# Altium footprint library DIOT_PSU_integrated.PcbLib: 35 footprints (part 1 of 3)
Each footprint in its own frame and in the unit in brackets; x right, y up, seen from the top. Pads: shape width x height; smd on the part's side, far side on the other; paste and mask are expansions set on the pad; w line width, h text height; cw(c..) or ccw(c..) is an arc to the next point about the centre after c.
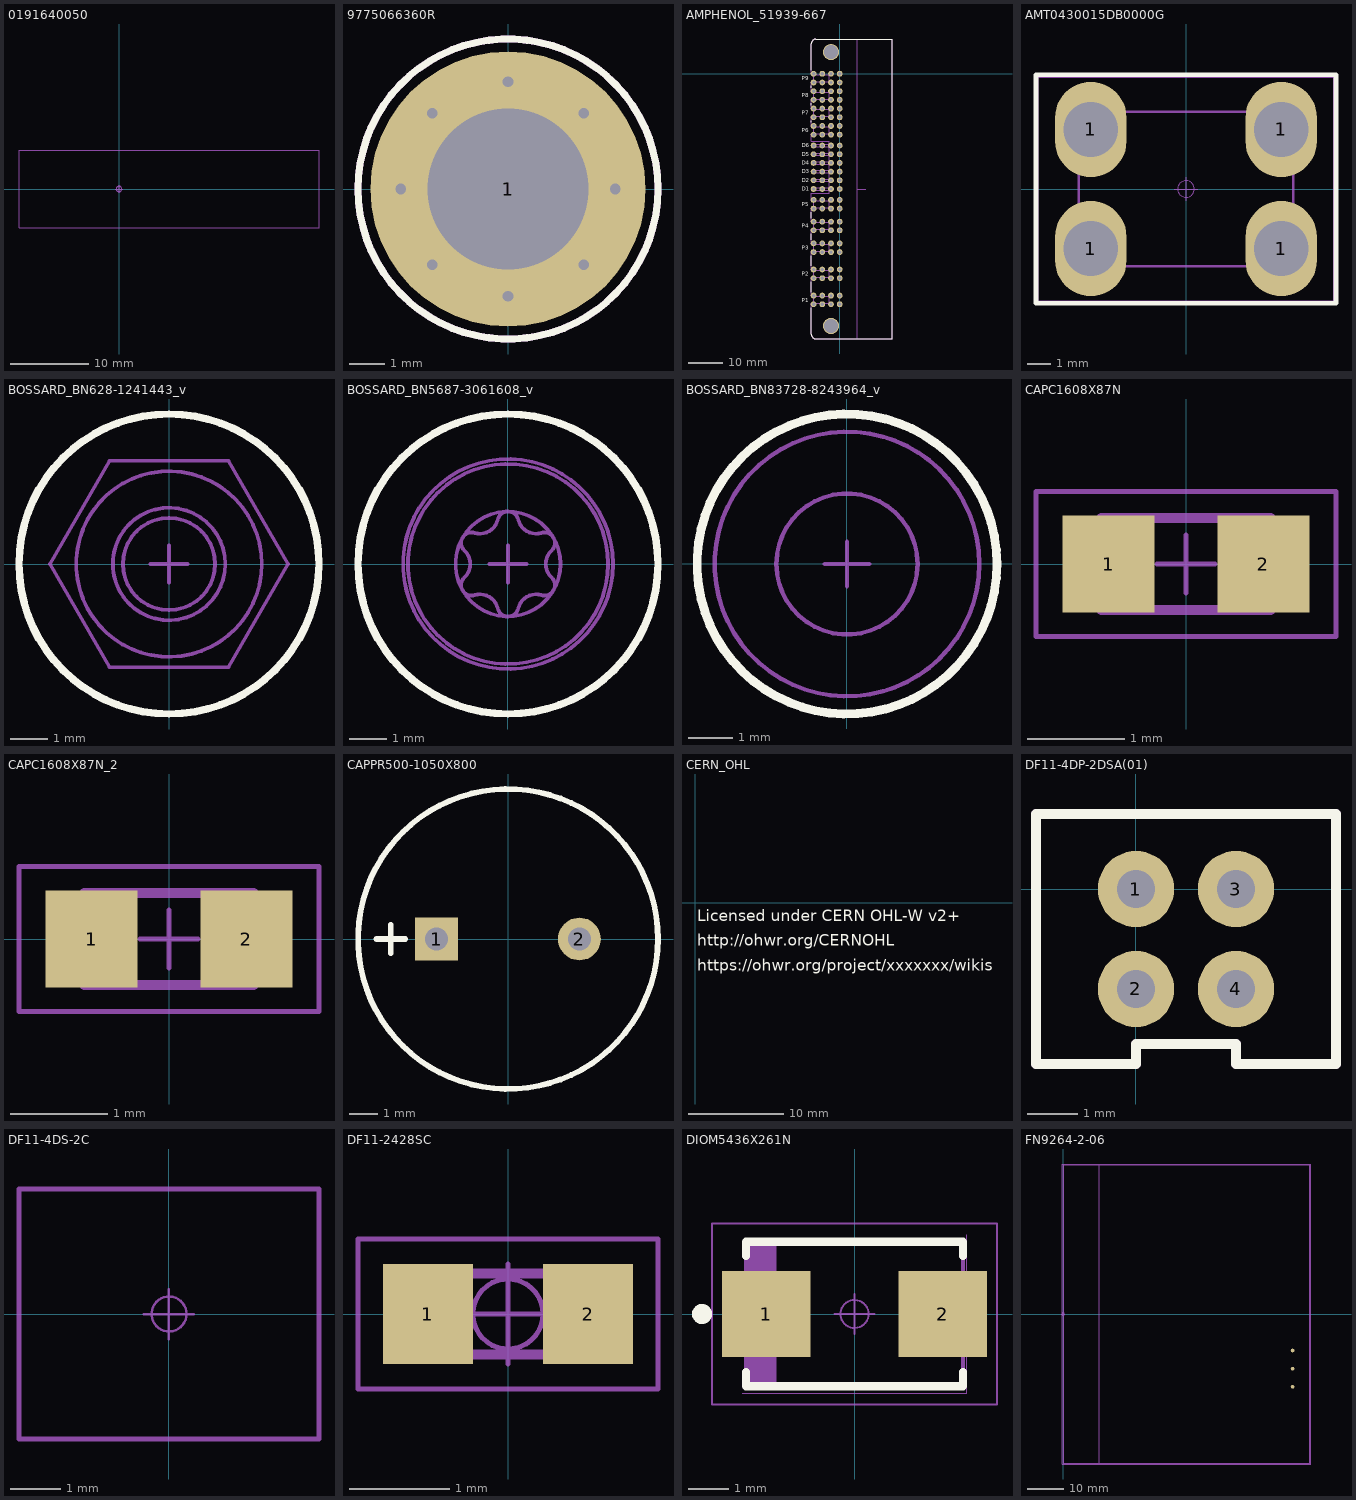
[diagram p0: the footprints below, top view; thin cyan lines are the x and y axes]

## 0191640050 [mm]
Mechanical 15:
  circle w0.05: c0,0 r0.35
  lines w0.05: -0.5,0 0.5,0 ; 0,-0.5 0,0.5 ; -12.7,-4.95 -12.7,4.95 25.4,4.95 25.4,-4.95 -12.7,-4.95
3D body "191640050.stp": height 3.85, standoff -3.85, extent -12.7,-4.953 25.4,4.953

## 9775066360R [mm]
pads (1):
  round 7.7 / inner round 6.6 / far side round 6.6 hole 4.5: 1(0,0)
via -3,0 diameter 0.6 hole 0.3
via -2.121,2.121 diameter 0.6 hole 0.3
via -2.121,-2.121 diameter 0.6 hole 0.3
via 3,0 diameter 0.6 hole 0.3
via 0,3 diameter 0.6 hole 0.3
via 0,-3 diameter 0.6 hole 0.3
via 2.121,-2.121 diameter 0.6 hole 0.3
via 2.121,2.121 diameter 0.6 hole 0.3
Top Overlay:
  circle w0.2: c0,0 r4.2
Top Paste:
  lines w1.4: -2.917,0.892 cw(c0,0) -2.718,1.385 ; -2.901,-0.943 ccw(c0,0) -2.693,-1.432 ; -1.432,2.693 cw(c0,0) -0.943,2.901 ; -1.385,-2.718 ccw(c0,0) -0.892,-2.917 ; 0.892,2.917 cw(c0,0) 1.385,2.718 ; 0.943,-2.901 ccw(c0,0) 1.432,-2.693 ; 2.693,1.432 cw(c0,0) 2.901,0.943 ; 2.718,-1.385 ccw(c0,0) 2.917,-0.892
Mechanical 14:
  circle w0.2: c0,0 r4.2
Mechanical 15:
  circle w0.05: c0,0 r0.35
  lines w0.05: -0.5,0 0.5,0 ; 0,-0.5 0,0.5 ; -1.5,-0.75 1.5,-0.75 1.5,0.75 -1.5,0.75 -1.5,-0.75
3D body "9775066360 (rev1).stp": height 1, standoff -6.6, extent -3,-2.997 2.988,2.997

## AMPHENOL_51939-667 [mm]
pads (98):
  round 1.7 hole 1: A1(0,-33.66) A2(0,-31.12) A3(0,-28.58) A4(0,-26.04) A5(0,-23.5) A6(0,-20.96) B1(-2.54,-33.66) B2(-2.54,-31.12) B3(-2.54,-28.58) B4(-2.54,-26.04) B5(-2.54,-23.5) B6(-2.54,-20.96) C1(-5.08,-33.66) C2(-5.08,-31.12) C3(-5.08,-28.58) C4(-5.08,-26.04) C5(-5.08,-23.5) C6(-5.08,-20.96) D1(-7.62,-33.66) D2(-7.62,-31.12) D3(-7.62,-28.58) D4(-7.62,-26.04) D5(-7.62,-23.5) D6(-7.62,-20.96) P1(-7.62,-67.32) P1(-7.62,-64.78) P1(-5.08,-67.32) P1(-5.08,-64.78) P1(-2.54,-67.32) P1(-2.54,-64.78) P1(0,-67.32) P1(0,-64.78) P2(-7.62,-59.7) P2(-7.62,-57.16) P2(-5.08,-59.7) P2(-5.08,-57.16) P2(-2.54,-59.7) P2(-2.54,-57.16) P2(0,-59.7) P2(0,-57.16) P3(-7.62,-52.08) P3(-7.62,-49.54) P3(-5.08,-52.08) P3(-5.08,-49.54) P3(-2.54,-52.08) P3(-2.54,-49.54) P3(0,-52.08) P3(0,-49.54) P4(-7.62,-45.73) P4(-7.62,-43.19) P4(-5.08,-45.73) P4(-5.08,-43.19) P4(-2.54,-45.73) P4(-2.54,-43.19) P4(0,-45.73) P4(0,-43.19) P5(-7.62,-39.38) P5(-7.62,-36.84) P5(-5.08,-39.38) P5(-5.08,-36.84) P5(-2.54,-39.38) P5(-2.54,-36.84) P5(0,-39.38) P5(0,-36.84) P6(-7.62,-17.78) P6(-7.62,-15.24) P6(-5.08,-17.78) P6(-5.08,-15.24) P6(-2.54,-17.78) P6(-2.54,-15.24) P6(0,-17.78) P6(0,-15.24) P7(-7.62,-12.7) P7(-7.62,-10.16) P7(-5.08,-12.7) P7(-5.08,-10.16) P7(-2.54,-12.7) P7(-2.54,-10.16) P7(0,-12.7) P7(0,-10.16) P8(-7.62,-7.62) P8(-7.62,-5.08) P8(-5.08,-7.62) P8(-5.08,-5.08) P8(-2.54,-7.62) P8(-2.54,-5.08) P8(0,-7.62) P8(0,-5.08) P9(-7.62,-2.54) P9(-7.62,0) P9(-5.08,-2.54) P9(-5.08,0) P9(-2.54,-2.54) P9(-2.54,0) P9(0,-2.54) P9(0,0)
  round 4.7 / inner round 4.7 / far side round 8 hole 4: MTG1(-2.54,6.345) MTG2(-2.54,-73.665)
Top Overlay:
  lines w0.2: -8.255,-68.338 -8.255,-76.149 ccw(c-6.934,-76.149) -6.934,-77.47 15.367,-77.47 15.367,10.16 -6.934,10.16 ccw(c-6.934,8.839) -8.255,8.839 -8.255,1.018 ; -8.255,-63.762 -8.255,-60.718 ; -8.255,-56.142 -8.255,-53.098 ; -8.255,-48.522 -8.255,-46.748 ; -8.255,-42.172 -8.255,-40.398 ; -8.255,-14.222 -8.255,-13.718 ; -8.255,-9.142 -8.255,-8.638 ; -8.255,-4.062 -8.255,-3.558
  text "D6" at -11.1,-21.5 h1.2
  text "D5" at -11.1,-24.14 h1.2
  text "D4" at -11.1,-26.58 h1.2
  text "D3" at -11.1,-29.12 h1.2
  text "D2" at -11.1,-31.66 h1.2
  text "D1" at -11.1,-34.2 h1.2
  text "P9" at -11.1,-1.84 h1.2
  text "P8" at -11.1,-6.92 h1.2
  text "P7" at -11.1,-12 h1.2
  text "P6" at -11.1,-17.08 h1.2
  text "P5" at -11.1,-38.68 h1.2
  text "P4" at -11.1,-45.03 h1.2
  text "P3" at -11.1,-51.38 h1.2
  text "P2" at -11.1,-59 h1.2
  text "P1" at -11.1,-66.7 h1.2
Mechanical 8:
  drawing of 404 lines, arcs and shapes, not listed
  text "PCB" at 4.4,-35.3 h1.2
Mechanical 14:
  circle w0.1: c-2.54,-73.66 r1.905
  circle w0.1: c-2.54,6.35 r1.905
  lines w0.1: -3.048,-33.985 -7.95,-33.985 -7.95,-33.325 -3.048,-33.325 ; -3.048,-31.445 -7.95,-31.445 -7.95,-30.785 -3.048,-30.785 ; -3.048,-28.905 -7.95,-28.905 -7.95,-28.245 -3.048,-28.245 ; -3.048,-26.365 -7.95,-26.365 -7.95,-25.705 -3.048,-25.705 ; -3.048,-23.825 -7.95,-23.825 -7.95,-23.165 -3.048,-23.165 ; -3.048,-21.285 -7.95,-21.285 -7.95,-20.625 -3.048,-20.625 ; -8.255,-76.149 ccw(c-6.934,-76.149) -6.934,-77.47 15.367,-77.47 15.367,10.16 -6.934,10.16 ccw(c-6.934,8.839) -8.255,8.839 -8.255,-0.254 -3.048,-0.254 -3.048,-2.286 -8.255,-2.286 -8.255,-5.334 -3.048,-5.334 -3.048,-7.366 -8.255,-7.366 -8.255,-10.414 -3.048,-10.414 -3.048,-12.446 -8.255,-12.446 -8.255,-15.494 -3.048,-15.494 -3.048,-17.526 -8.255,-17.526 -8.255,-19.685 -3.048,-19.685 -3.048,-34.925 -8.255,-34.925 -8.255,-37.084 -3.048,-37.084 -3.048,-39.116 -8.255,-39.116 -8.255,-43.434 -3.048,-43.434 -3.048,-45.466 -8.255,-45.466 -8.255,-49.784 -3.048,-49.784 -3.048,-51.816 -8.255,-51.816 -8.255,-57.404 -3.048,-57.404 -3.048,-59.436 -8.255,-59.436 -8.255,-65.024 -3.048,-65.024 -3.048,-67.056 -8.255,-67.056 -8.255,-76.149
  text "P1" at -11.1,-66.7 h1.2
  text "P2" at -11.1,-59 h1.2
  text "P3" at -11.1,-51.38 h1.2
  text "P4" at -11.1,-45.03 h1.2
  text "P5" at -11.1,-38.68 h1.2
  text "P6" at -11.1,-17.08 h1.2
  text "P7" at -11.1,-12 h1.2
  text "P8" at -11.1,-6.92 h1.2
  text "P9" at -11.1,-1.84 h1.2
  text "D1" at -11.1,-34.2 h1.2
  text "D2" at -11.1,-31.66 h1.2
  text "D3" at -11.1,-29.12 h1.2
  text "D4" at -11.1,-26.58 h1.2
  text "D5" at -11.1,-24.14 h1.2
  text "D6" at -11.1,-21.5 h1.2
3D body "AMPHENOL_51939-667.stp": height 12.57, standoff -3.43, extent -8.255,-77.47 15.367,10.16

## AMT0430015DB0000G [mm]
pads (4):
  oval 3x4 hole 2.3: 1(-4,-2.5) 1(-4,2.5) 1(4,-2.5) 1(4,2.5)
Top Overlay:
  lines w0.2: -6.3,-4.8 6.3,-4.8 6.3,4.8 -6.3,4.8 -6.3,-4.8
Mechanical 14:
  lines w0.1: -4.5,-3.25 -4.5,3.25 4.5,3.25 4.5,-3.25 -4.5,-3.25
Mechanical 15:
  circle w0.05: c0,0 r0.35
  lines w0.05: -0.5,0 0.5,0 ; 0,-0.5 0,0.5 ; -6.2,-4.7 6.2,-4.7 6.2,4.7 -6.2,4.7 -6.2,-4.7
3D body "AMT0430015DB0000G.stp": height 12.01, standoff -3.49, extent -4.5,-3.25 4.5,3.25

## BOSSARD_BN628-1241443_v [mm]
Top Overlay:
  circle w0.2: c0,0 r4
Mechanical 8:
  lines w0.1: -0.5,0 0,0 ; 0,-0.5 0,0 ; 0,0.5 0,0 ; 0.5,0 0,0
Mechanical 14:
  circle w0.1: c0,0 r1.229
  circle w0.1: c0,0 r1.5
  circle w0.1: c0,0 r2.475
  lines w0.1: -3.175,0 -1.588,-2.75 1.588,-2.75 3.175,0 1.588,2.75 -1.588,2.75 -3.175,0
3D body "BOSSARD_BN628-1241443_v.stp": height 2.4, standoff 0, extent -3.175,-2.75 3.176,2.75

## BOSSARD_BN5687-3061608_v [mm]
Top Overlay:
  circle w0.2: c0,0 r4
Mechanical 8:
  lines w0.1: -0.5,0 0,0 ; 0,-0.5 0,0 ; 0,0.5 0,0 ; 0.5,0 0,0
Mechanical 14:
  circle w0.1: c0,0 r2.8
  circle w0.1: c0,0 r1.4
  circle w0.1: c0,0 r2.669
  lines w0.1: -1.162,-0.356 ccw(c-0.97,-0.56) -0.89,-0.828 cw(c-0.749,-1.298) -0.272,-1.185 ccw(c0,-1.12) 0.272,-1.185 cw(c0.749,-1.298) 0.89,-0.828 ccw(c0.97,-0.56) 1.162,-0.356 cw(c1.498,0) 1.162,0.356 ccw(c0.97,0.56) 0.89,0.828 cw(c0.749,1.298) 0.272,1.185 ccw(c0,1.12) -0.272,1.185 cw(c-0.749,1.298) -0.89,0.828 ccw(c-0.97,0.56) -1.162,0.356 cw(c-1.498,0) -1.162,-0.356
3D body "BOSSARD_BN5687-3061608_v.stp": height 2.4, standoff -10, extent -2.8,-2.8 2.8,2.8

## BOSSARD_BN83728-8243964_v [mm]
Top Overlay:
  circle w0.2: c0,0 r3.4
Mechanical 8:
  lines w0.1: -0.5,0 0,0 ; 0,-0.5 0,0 ; 0,0.5 0,0 ; 0.5,0 0,0
Mechanical 14:
  circle w0.1: c0,0 r1.6
  circle w0.1: c0,0 r3
3D body "BOSSARD_BN83728-8243964_v.stp": height 0.4, standoff 0, extent -3,-2.999 3,2.999

## CAPC1608X87N [mm]
pads (2):
  rect 0.95x1 smd: 1(-0.8,0) 2(0.8,0)
Mechanical 14:
  lines w0.1: -0.875,-0.475 0.875,-0.475 0.875,0.475 -0.875,0.475 -0.875,-0.475
Mechanical 15:
  lines w0.05: -0.3,0 0.3,0 ; 0,-0.3 0,0.3 ; -1.55,-0.75 -1.55,0.75 1.55,0.75 1.55,-0.75 -1.55,-0.75
3D body "CAPC1608X87N.stp": height 0.87, standoff 0, extent -0.875,-0.475 0.875,0.475

## CAPC1608X87N_2 [mm]
pads (2):
  rect 0.95x1 smd: 1(-0.8,0) 2(0.8,0)
Mechanical 14:
  lines w0.1: -0.875,-0.475 0.875,-0.475 0.875,0.475 -0.875,0.475 -0.875,-0.475
Mechanical 15:
  lines w0.05: -0.3,0 0.3,0 ; 0,-0.3 0,0.3 ; -1.55,-0.75 -1.55,0.75 1.55,0.75 1.55,-0.75 -1.55,-0.75
3D body "CAPC1608X87N.stp": height 0.87, standoff 0, extent -0.875,-0.475 0.875,0.475

## CAPPR500-1050X800 [mm]
pads (2):
  rect 1.5x1.5 hole 0.8: 1(-2.5,0)
  round 1.5 hole 0.8: 2(2.5,0)
Top Overlay:
  circle w0.2: c0,0 r5.25
  lines w0.2: -4.6,0 -3.6,0 ; -4.1,-0.5 -4.1,0.5
Mechanical 14:
  circle w0.1: c0,0 r5.25
  lines w0.1: -4.6,0 -3.6,0 ; -4.1,-0.5 -4.1,0.5
3D body "CAPPR500-1050X800.stp": height 8, standoff -3.6, extent -5.25,-5.228 5.25,5.228

## CERN_OHL [mm]
Top Overlay:
  text "http://ohwr.org/CERNOHL" at 0.2,-4.5 h1.2
  text "https://ohwr.org/project/xxxxxxx/wikis" at 0.2,-7.1 h1.2
  text "Licensed under CERN OHL-W v2+" at 0.2,-1.9 h1.2

## DF11-4DP-2DSA(01) [mil]
pads (4):
  round 60 hole 30: 1(0,0) 2(0,-78.74) 3(78.74,0) 4(78.74,-78.74)
Top Overlay:
  lines w7.87: 157.48,-137.8 157.48,-137.8 ; 157.48,-137.8 78.74,-137.8 78.74,-122.05 0,-122.05 0,-137.8 -78.74,-137.8 -78.74,59.06 157.48,59.06 157.48,-137.8
Mechanical 5:
  lines w7.87: 157.48,-137.8 157.48,59.06 -78.74,59.06 -78.74,-137.8 0,-137.8 0,-122.05 78.74,-122.05 78.74,-137.8 157.48,-137.8 ; 157.48,-137.8 157.48,-137.8
  text "'.Designator' / '.ComponentSymbol'" at -41.34,-56.1 h19.68
3D body "DF11-4DP-2DSA.stp": height 259.84, standoff -118.11, extent -78.74,-137.8 157.48,59.06

## DF11-4DS-2C [mm]
Mechanical 14:
  lines w0.1: -3,-2.5 -3,2.5 3,2.5 3,-2.5 -3,-2.5
Mechanical 15:
  circle w0.05: c0,0 r0.35
  lines w0.05: -0.5,0 0.5,0 ; 0,-0.5 0,0.5 ; -3,-2.5 3,-2.5 3,2.5 -3,2.5 -3,-2.5
3D body "DF11-4DS-2C.stp": height 0.01, standoff -7.29, extent -3,-2.5 3,2.5

## DF11-2428SC [mm]
pads (2):
  rect 0.9x1 smd: 1(-0.8,0) 2(0.8,0)
Mechanical 14:
  lines w0.1: -0.8,-0.405 0.8,-0.405 0.8,0.405 -0.8,0.405 -0.8,-0.405
Mechanical 15:
  circle w0.05: c0,0 r0.35
  lines w0.05: -0.5,0 0.5,0 ; 0,-0.5 0,0.5 ; -1.5,-0.75 -1.5,0.75 1.5,0.75 1.5,-0.75 -1.5,-0.75
3D body "RESC1608X55N.stp": height 0.55, standoff 0, extent -0.875,-0.475 0.875,0.475

## DIOM5436X261N [mm]
pads (2):
  rect 2.2x2.15 smd: 1(-2.2,0) 2(2.2,0)
Top Overlay:
  circle w0.25: c-3.8,0 r0.125
  lines w0.2: -2.7,-1.45 -2.7,-1.8 2.7,-1.8 2.7,-1.45 ; -2.7,1.45 -2.7,1.8 2.7,1.8 2.7,1.45
Mechanical 8:
  lines w0.001: -2.795,-1.97 2.795,-1.97 2.795,1.97
Mechanical 14:
  lines w0.1: -2.6,-1.81 -2.6,1.81 ; -2.5,-1.81 -2.5,1.81 ; -2.4,-1.81 -2.4,1.81 ; -2.3,-1.81 -2.3,1.81 ; -2.2,-1.81 -2.2,1.81 ; -2.1,-1.81 -2.1,1.81 ; -2,-1.81 -2,1.81 ; -2.7,-1.81 -2.7,1.81 2.7,1.81 2.7,-1.81 -2.7,-1.81
Mechanical 15:
  circle w0.05: c0,0 r0.35
  lines w0.05: -0.5,0 0.5,0 ; 0,-0.5 0,0.5 ; -3.55,-2.25 -3.55,2.25 3.55,2.25 3.55,-2.25 -3.55,-2.25
3D body "DIOM5436X261N.stp": height 2.59, standoff 0, extent -2.7,-1.95 2.7,1.95

## FN9264-2-06 [mm]
pads (3):
  round 1 smd: 1(63,-10) 2(63,-15) 3(63,-20)
Mechanical 14:
  lines w0.1: 0,-40.975 67.75,-40.975 67.75,40.975 0,40.975 0,-40.975
  lines w0.2: 9.95,-40.975 9.95,40.975
  text "Fron Panel" at 9.25,-31.997 h2
Mechanical 15:
  circle w0.05: c0,0 r0.35
  lines w0.05: -0.5,0 0.5,0 ; 0,-0.5 0,0.5 ; -0.2,-41.175 -0.2,41.2 67.975,41.2 67.975,-41.175 -0.2,-41.175
3D body "FN281-1...10-06.stp": height 32.26, standoff 0.26, extent 0,-40.975 67.75,40.975